# Altium footprint library LEMO THD_OLD.PcbLib: 54 footprints (part 1 of 4)
Each footprint in its own frame and in the unit in brackets; x right, y up, seen from the top. Pads: shape width x height; smd on the part's side, far side on the other; paste and mask are expansions set on the pad; w line width, h text height; cw(c..) or ccw(c..) is an arc to the next point about the centre after c.
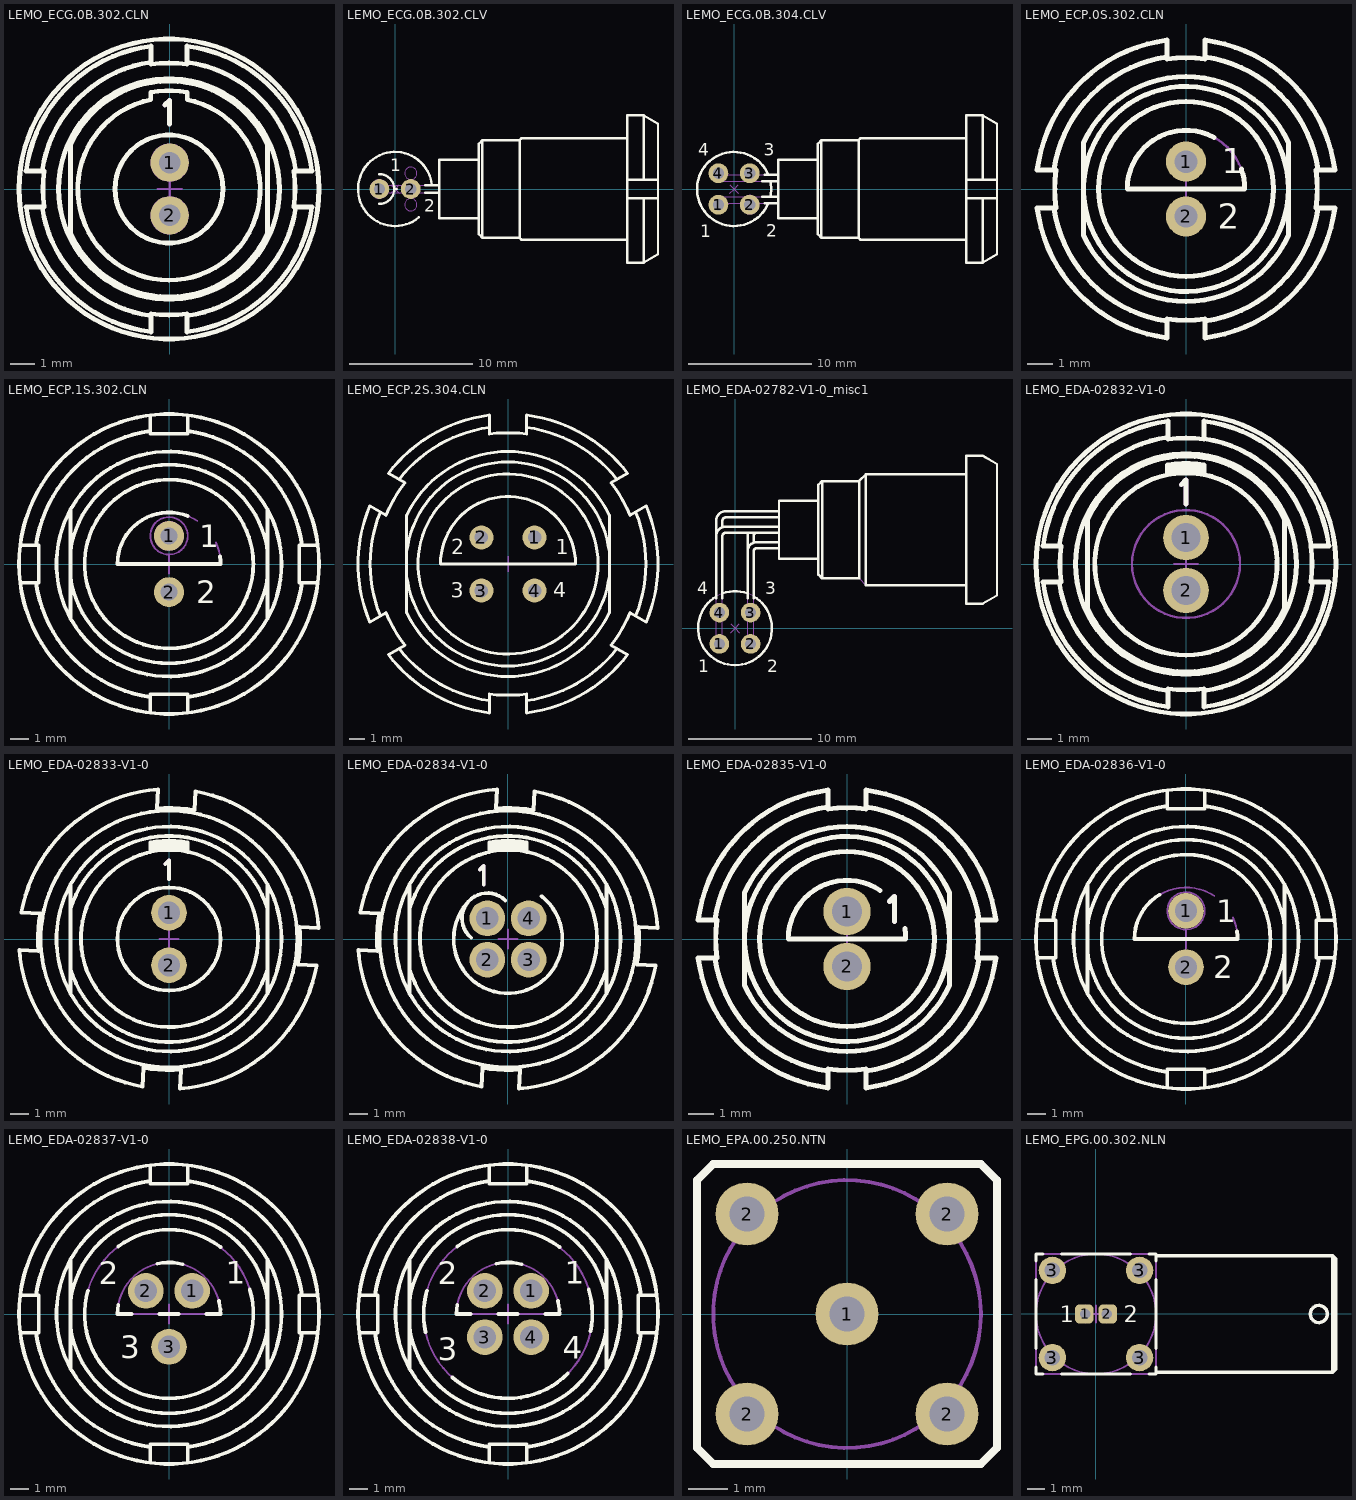
[diagram p0: the footprints below, top view; thin cyan lines are the x and y axes]

## LEMO_ECG.0B.302.CLN [mm] "Size 0B, 2 Female Contacts Straight Receptacle With Two Nut For Panel Mounting"
height 16.4
pads (2):
  round 1.6 hole 0.9: 1(0,1.1) 2(0,-1.1)
Top Overlay:
  circle w0.2: c-0.025,0 r2.25
  circle w0.2: c-0.025,0 r6.25
  circle w0.2: c-0.025,0 r4.6
  lines w0.2: -5.308,-0.75 ccw(c-0.025,0) -0.775,-5.283 ; -5.308,0.75 cw(c-0.025,0) -0.775,5.283 ; -0.2,3.5 0,3.7 0,2.7 ; 0.725,-5.283 ccw(c-0.025,0) 5.258,-0.75 ; 0.725,5.283 cw(c0.031,0.056) 5.258,0.75 ; -4.125,-1.855 ccw(c-0.025,0) 4.075,-1.855 ; -4.125,-1.855 ccw(c-0.025,0) 4.075,-1.855 ; -4.125,-1.855 -4.125,1.855 cw(c-0.025,0) 4.075,1.855 4.075,-1.855 ; -5.978,-0.75 ccw(c-0.025,0) -0.775,-5.953 -0.775,-5.196 ccw(c-0.025,0) 0.725,-5.196 0.725,-5.953 ccw(c-0.025,0) 5.928,-0.75 5.171,-0.75 ccw(c-0.025,0) 5.171,0.75 5.928,0.75 ccw(c-0.025,0) 0.725,5.953 0.725,5.196 ccw(c-0.025,0) -0.775,5.196 -0.775,5.953 ccw(c-0.025,0) -5.978,0.75 -5.221,0.75 ccw(c-0.025,0) -5.221,-0.75 -5.978,-0.75 ; -0.785,3.723 ccw(c-0.025,0) 0.735,3.723 0.735,4.029 ccw(c-0.025,0) -0.785,4.029 -0.785,3.723
Mechanical 8:
  lines w0.1: -0.5,-1.1 0,-1.1 ; -0.5,0 0,0 ; -0.5,1.1 0,1.1 ; 0,-1.6 0,-1.1 ; 0,-0.6 0,-1.1 ; 0,-0.5 0,0 ; 0,0.5 0,0 ; 0,0.6 0,1.1 ; 0,1.6 0,1.1 ; 0.5,-1.1 0,-1.1 ; 0.5,0 0,0 ; 0.5,1.1 0,1.1
Mechanical 14:
  circle w0.1: c0,1.1 r0.75
  circle w0.1: c0,-1.1 r0.75
  circle w0.1: c0,-1.1 r0.55
  circle w0.1: c0,1.1 r0.55
  circle w0.1: c-0.025,0 r2.25
  circle w0.1: c-0.025,0 r4.6
  circle w0.1: c-0.025,0 r6.25
  lines w0.1: -5.308,-0.75 ccw(c-0.025,0) -0.775,-5.283 ; -5.308,0.75 cw(c-0.025,0) -0.775,5.283 ; 0.725,-5.283 ccw(c-0.025,0) 5.258,-0.75 ; 0.725,5.283 cw(c0.031,0.056) 5.258,0.75 ; -4.125,-1.855 ccw(c-0.025,0) 4.075,-1.855 ; -4.125,-1.855 ccw(c-0.025,0) 4.075,-1.855 ; -4.125,-1.855 -4.125,1.855 cw(c-0.025,0) 4.075,1.855 4.075,-1.855 ; -5.978,-0.75 ccw(c-0.025,0) -0.775,-5.953 -0.775,-5.196 ccw(c-0.025,0) 0.725,-5.196 0.725,-5.953 ccw(c-0.025,0) 5.928,-0.75 5.171,-0.75 ccw(c-0.025,0) 5.171,0.75 5.928,0.75 ccw(c-0.025,0) 0.725,5.953 0.725,5.196 ccw(c-0.025,0) -0.775,5.196 -0.775,5.953 ccw(c-0.025,0) -5.978,0.75 -5.221,0.75 ccw(c-0.025,0) -5.221,-0.75 -5.978,-0.75 ; -0.785,3.723 ccw(c-0.025,0) 0.735,3.723 0.735,4.029 ccw(c-0.025,0) -0.785,4.029 -0.785,3.723
  lines w0.2: -0.2,3.5 0,3.7 0,2.7
3D body "LEMO_ECG.0B.302.CLN_Part2.stp": height 16.1, standoff 13.6, extent -5.978,-5.953 5.928,5.953
3D body "LEMO_ECG.0B.302.CLN_Part3.stp": height 11.3, standoff 10.3, extent -6.275,-6.25 6.225,6.25
3D body "LEMO_ECG.0B.302.CLN_Part4.stp": height 10.3, standoff 8.29, extent -5.525,-6.199 5.475,6.199
3D body "LEMO_ECG.0B.302.CLN_Part1.stp": height 16.5, standoff -3, extent -4.125,-4.482 4.075,4.483

## LEMO_ECG.0B.302.CLV [mm] "Size 0B, 2 Female Contacts Elbow Receptacle (90°) With Two Nut For Panel Mounting"
height 15.5
pads (2):
  round 1.6 hole 0.9: 1(-1.27,0) 2(1.27,0)
Top Overlay:
  lines w0.2: -1.27,-1.2 ccw(c-1.27,0) -1.27,1.2 ; 0,0 0.125,0 ; 1.923,-2.303 cw(c0,0) 2.985,0.3 ; 2.432,-0.3 3.57,-0.3 ; 2.432,0.3 3.57,0.3 ; 6.77,-2.36 3.57,-2.36 3.57,2.36 6.77,2.36 ; 18.77,-4.1 10.22,-4.1 10.07,-3.95 ; 18.77,-0.75 21.27,-0.75 ; 18.77,0.75 21.27,0.75 ; 18.77,4.1 10.22,4.1 10.07,3.95 ; 20.12,-0.75 20.12,-5.953 ; 20.12,0.75 20.12,5.953 ; 7.07,-3.95 6.77,-3.65 6.77,3.65 7.07,3.95 ; 7.07,-3.95 10.07,-3.95 ; 7.07,-3.95 7.07,3.95 ; 7.07,3.95 10.07,3.95 ; 10.07,-3.95 10.07,3.95 ; 20.12,-5.953 21.27,-5.283 21.27,5.283 20.12,5.953 ; 20.12,-5.953 18.77,-5.953 18.77,5.953 20.12,5.953
  text "2" at 2.352,-1.842 h1
  text "1" at -0.4,1.425 h1
Mechanical 8:
  lines w0.1: -1.77,0 -1.27,0 ; -1.27,-0.5 -1.27,0 ; -1.27,0.5 -1.27,0 ; -0.77,0 -1.27,0 ; -0.354,-0.354 0,0 ; -0.354,0.354 0,0 ; 0.354,-0.354 0,0 ; 0.354,0.354 0,0 ; 0.77,0 1.27,0 ; 1.27,-0.5 1.27,0 ; 1.27,0.5 1.27,0 ; 1.77,0 1.27,0
Mechanical 14:
  circle w0.1: c1.27,1.27 r0.498
  circle w0.1: c1.27,-1.27 r0.498
  lines w0.1: -1.27,-1.2 ccw(c-1.27,0) -1.27,1.2 ; -0.583,-0.3 cw(c-1.27,0) -0.583,0.3 ; 0,0 0.125,0 ; 0.872,-0.3 ccw(c1.27,0) 1.668,-0.3 ; 0.872,0.3 cw(c1.27,0) 1.668,0.3 ; 1.923,-2.303 cw(c0,0) 2.985,0.3 ; 3.57,-0.3 -1.27,-0.3 cw(c-1.27,0) -1.27,0.3 3.57,0.3 ; 6.77,-2.36 3.57,-2.36 3.57,2.36 6.77,2.36 ; 18.77,-4.1 10.22,-4.1 10.07,-3.95 ; 18.77,-0.75 21.27,-0.75 ; 18.77,0.75 21.27,0.75 ; 18.77,4.1 10.22,4.1 10.07,3.95 ; 20.12,-0.75 20.12,-5.953 ; 20.12,0.75 20.12,5.953 ; 7.07,-3.95 6.77,-3.65 6.77,3.65 7.07,3.95 ; 7.07,-3.95 10.07,-3.95 ; 7.07,-3.95 7.07,3.95 ; 7.07,3.95 10.07,3.95 ; 10.07,-3.95 10.07,3.95 ; 20.12,-5.953 21.27,-5.283 21.27,5.283 20.12,5.953 ; 20.12,-5.953 18.77,-5.953 18.77,5.953 20.12,5.953
  text "2" at 2.352,-1.842 h1
  text "1" at -0.4,1.425 h1
3D body "LEMO_ECG.0B.302.CLV_Part1.stp": height 10.73, standoff -3.7, extent -1.57,-4.1 21.27,4.1
3D body "LEMO_ECG.0B.302.CLV_Part2.stp": height 12.2, standoff 0.3, extent 18.77,-5.953 21.27,5.953
3D body "LEMO_ECG.0B.302.CLV_Part3.stp": height 12.5, standoff 0, extent 15.27,-6.25 16.27,6.25
3D body "LEMO_ECG.0B.302.CLV_Part4.stp": height 12.45, standoff 0.05, extent 13.265,-5.5 15.265,5.5
3D body "LEMO_ECG.0B.302.CLV_Part5.stp": height 2.3, standoff 0, extent -3,-3 3,3
3D body "LEMO_ECG.0B.302.CLV_Part6.stp": height -3.7, standoff -8.7, extent -1.57,-0.3 1.57,0.3
3D body "LEMO_ECG.0B.302.CLV_Part7.stp": height -8.7, standoff -13.7, extent -1.57,-0.3 1.57,0.3
3D body "LEMO_ECG.0B.302.CLV_Part8.stp": height -8.7, standoff -13.7, extent -1.57,-0.3 1.57,0.3
3D body "LEMO_ECG.0B.302.CLV_Part9.stp": height -13.7, standoff -18.7, extent -1.57,-0.3 1.57,0.3
3D body "LEMO_ECG.0B.302.CLV_Part10.stp": height -18.7, standoff -23.7, extent -1.57,-0.3 1.57,0.3
3D body "LEMO_ECG.0B.302.CLV_Part11.stp": height -23.7, standoff -28.7, extent -1.57,-0.3 1.57,0.3
3D body "LEMO_ECG.0B.302.CLV_Part12.stp": height -28.7, standoff -33.7, extent -1.57,-0.3 1.57,0.3
3D body "LEMO_ECG.0B.302.CLV_Part13.stp": height -33.7, standoff -38.7, extent -1.57,-0.3 1.57,0.3

## LEMO_ECG.0B.304.CLV [mm] "Size 0B, 4 Female Contacts Elbow Receptacle (90°) With Two Nut For Panel Mounting"
height 15.5
pads (4):
  round 1.6 hole 0.9: 1(-1.27,-1.27) 2(1.27,-1.27) 3(1.27,1.27) 4(-1.27,1.27)
Top Overlay:
  lines w0.2: 2.288,-0.634 3.57,-0.634 ; 2.288,0.634 3.57,0.634 ; 2.462,-1.134 3.57,-1.134 ; 2.462,1.134 3.57,1.134 ; 2.777,-1.134 cw(c0,0) 2.777,1.134 ; 2.932,-0.634 ccw(c0,0) 2.932,0.634 ; 6.77,-2.36 3.57,-2.36 3.57,2.36 6.77,2.36 ; 18.77,-4.1 10.22,-4.1 10.07,-3.95 ; 18.77,-0.75 21.27,-0.75 ; 18.77,0.75 21.27,0.75 ; 18.77,4.1 10.22,4.1 10.07,3.95 ; 20.12,-0.75 20.12,-5.953 ; 20.12,0.75 20.12,5.953 ; 21.27,-4.1 21.27,4.1 ; 7.07,-3.95 7.07,3.95 ; 7.07,-3.95 10.07,-3.95 ; 7.07,-3.95 6.77,-3.65 6.77,3.65 7.07,3.95 ; 7.07,3.95 10.07,3.95 ; 10.07,-3.95 10.07,3.95 ; 20.12,-5.953 18.77,-5.953 18.77,5.953 20.12,5.953 ; 20.12,-5.953 21.27,-5.283 21.27,5.283 20.12,5.953
  text "2" at 2.602,-3.868 h1
  text "1" at -2.75,-3.9 h1
  text "3" at 2.402,2.708 h1
  text "4" at -2.898,2.708 h1
Mechanical 8:
  lines w0.1: -1.77,-1.27 -1.27,-1.27 ; -1.77,1.27 -1.27,1.27 ; -1.27,-1.77 -1.27,-1.27 ; -1.27,-0.77 -1.27,-1.27 ; -1.27,0.77 -1.27,1.27 ; -1.27,1.77 -1.27,1.27 ; -0.77,-1.27 -1.27,-1.27 ; -0.77,1.27 -1.27,1.27 ; -0.354,-0.354 0,0 ; -0.354,0.354 0,0 ; 0.354,-0.354 0,0 ; 0.354,0.354 0,0 ; 0.77,-1.27 1.27,-1.27 ; 0.77,1.27 1.27,1.27 ; 1.27,-1.77 1.27,-1.27 ; 1.27,-0.77 1.27,-1.27 ; 1.27,0.77 1.27,1.27 ; 1.27,1.77 1.27,1.27 ; 1.77,-1.27 1.27,-1.27 ; 1.77,1.27 1.27,1.27
Mechanical 14:
  lines w0.1: -1.514,-1.055 ccw(c-1.27,-1.27) -0.969,-1.147 ; -1.514,1.055 cw(c-1.27,1.27) -0.969,1.147 ; 0.532,-1.134 ccw(c1.27,-1.27) 2.008,-1.134 ; 0.873,-0.634 cw(c1.27,-1.27) 1.667,-0.634 ; 0.975,1.134 cw(c1.27,1.27) 1.565,1.134 ; 1.02,-1.134 1.02,-1.27 ccw(c1.27,-1.27) 1.52,-1.27 1.52,-1.134 ; 1.02,1.134 1.02,1.27 cw(c1.27,1.27) 1.52,1.27 1.52,1.134 ; 2.777,-1.134 cw(c0,0) 2.777,1.134 ; 2.932,-0.634 ccw(c0,0) 2.932,0.634 ; 3.57,-1.134 -0.92,-1.134 ccw(c-0.92,-1.234) -1.02,-1.234 -1.02,-1.27 cw(c-1.27,-1.27) -1.52,-1.27 -1.52,-1.134 cw(c-1.02,-1.134) -1.02,-0.634 3.57,-0.634 ; 3.57,0.634 -1.02,0.634 cw(c-1.02,1.134) -1.52,1.134 -1.52,1.27 cw(c-1.27,1.27) -1.02,1.27 -1.02,1.234 ccw(c-0.92,1.234) -0.92,1.134 3.57,1.134 ; 6.77,-2.36 3.57,-2.36 3.57,2.36 6.77,2.36 ; 18.77,-4.1 10.22,-4.1 10.07,-3.95 ; 18.77,-0.75 21.27,-0.75 ; 18.77,0.75 21.27,0.75 ; 18.77,4.1 10.22,4.1 10.07,3.95 ; 20.12,-0.75 20.12,-5.953 ; 20.12,0.75 20.12,5.953 ; 21.27,-4.1 21.27,4.1 ; 7.07,-3.95 7.07,3.95 ; 7.07,-3.95 10.07,-3.95 ; 7.07,-3.95 6.77,-3.65 6.77,3.65 7.07,3.95 ; 7.07,3.95 10.07,3.95 ; 10.07,-3.95 10.07,3.95 ; 20.12,-5.953 18.77,-5.953 18.77,5.953 20.12,5.953 ; 20.12,-5.953 21.27,-5.283 21.27,5.283 20.12,5.953
  text "2" at 2.602,-3.868 h1
  text "1" at -2.75,-3.9 h1
  text "3" at 2.402,2.708 h1
  text "4" at -2.898,2.708 h1
3D body "LEMO_ECG.0B.304.CLV_Part12.stp": height -33.7, standoff -38.7, extent -1.52,-1.52 1.52,1.52
3D body "LEMO_ECG.0B.304.CLV_Part11.stp": height -28.7, standoff -33.7, extent -1.52,-1.52 1.52,1.52
3D body "LEMO_ECG.0B.304.CLV_Part10.stp": height -23.7, standoff -28.7, extent -1.52,-1.52 1.52,1.52
3D body "LEMO_ECG.0B.304.CLV_Part7.stp": height -8.7, standoff -13.7, extent -1.52,-1.52 1.52,1.52
3D body "LEMO_ECG.0B.304.CLV_Part6.stp": height -3.7, standoff -8.7, extent -1.52,-1.52 1.52,1.52
3D body "LEMO_ECG.0B.304.CLV_Part2.stp": height 12.2, standoff 0.3, extent 18.77,-5.953 21.27,5.953
3D body "LEMO_ECG.0B.304.CLV_Part1.stp": height 10.75, standoff -3.7, extent -1.52,-4.1 21.27,4.1
3D body "LEMO_ECG.0B.304.CLV_Part3.stp": height 12.5, standoff 0, extent 15.27,-6.25 16.27,6.25
3D body "LEMO_ECG.0B.304.CLV_Part4.stp": height 12.45, standoff 0.05, extent 13.265,-5.5 15.265,5.5
3D body "LEMO_ECG.0B.304.CLV_Part5.stp": height 2.3, standoff 0, extent -3,-3 3,3
3D body "LEMO_ECG.0B.304.CLV_Part8.stp": height -13.7, standoff -18.7, extent -1.52,-1.52 1.52,1.52
3D body "LEMO_ECG.0B.304.CLV_Part9.stp": height -18.7, standoff -23.7, extent -1.52,-1.52 1.52,1.52

## LEMO_ECP.0S.302.CLN [mm] "Size 0S, Fixed Receptacle with 2 Nuts, Straight Contacts 1 Female + 1 Male  (Hermaphroditic Keying)"
height 15
pads (2):
  round 1.6 hole 0.9: 1(0,1.1) 2(0,-1.1)
Top Overlay:
  circle w0.2: c0,0 r3.5
  circle w0.2: c0,0 r4.1
  lines w0.2: -5.283,-0.75 ccw(c0,0) -0.75,-5.283 ; -5.283,0.75 cw(c0,0) -0.75,5.283 ; 0.75,-5.283 ccw(c0,0) 5.283,-0.75 ; 0.75,5.283 cw(c0,0) 5.283,0.75 ; 1.114,2.069 ccw(c0,0) -2.35,0 2.35,0 ccw(c0,0) 2.213,0.79 ; -5.953,-0.75 ccw(c0,0) -0.75,-5.953 -0.75,-5.196 ccw(c0,0) 0.75,-5.196 0.75,-5.953 ccw(c0,0) 5.953,-0.75 5.196,-0.75 ccw(c0,0) 5.196,0.75 5.953,0.75 ccw(c0,0) 0.75,5.953 0.75,5.196 ccw(c0,0) -0.75,5.196 -0.75,5.953 ccw(c0,0) -5.953,0.75 -5.196,0.75 ccw(c0,0) -5.196,-0.75 -5.953,-0.75 ; -4.1,-1.855 ccw(c0,0) 4.1,-1.855 4.1,1.855 ccw(c0,0) -4.1,1.855 -4.1,-1.855
  text "2" at 1.27,-1.587 h1
  text "1" at 1.429,0.635 h1
Mechanical 8:
  lines w0.1: -0.5,-1.1 0,-1.1 ; -0.5,0 0,0 ; -0.5,1.1 0,1.1 ; 0,-1.6 0,-1.1 ; 0,-0.6 0,-1.1 ; 0,-0.5 0,0 ; 0,0.5 0,0 ; 0,0.6 0,1.1 ; 0,1.6 0,1.1 ; 0.5,-1.1 0,-1.1 ; 0.5,0 0,0 ; 0.5,1.1 0,1.1
Mechanical 14:
  circle w0.1: c0,-1.1 r0.35
  circle w0.4: c0,-1.1 r0.2
  circle w0.1: c0,1.1 r0.35
  circle w0.1: c0,0 r3.5
  circle w0.1: c0,0 r4.1
  lines w0.1: -5.283,-0.75 ccw(c0,0) -0.75,-5.283 ; -5.283,0.75 cw(c0,0) -0.75,5.283 ; 0.75,-5.283 ccw(c0,0) 5.283,-0.75 ; 0.75,5.283 cw(c0,0) 5.283,0.75 ; -5.953,-0.75 ccw(c0,0) -0.75,-5.953 -0.75,-5.196 ccw(c0,0) 0.75,-5.196 0.75,-5.953 ccw(c0,0) 5.953,-0.75 5.196,-0.75 ccw(c0,0) 5.196,0.75 5.953,0.75 ccw(c0,0) 0.75,5.953 0.75,5.196 ccw(c0,0) -0.75,5.196 -0.75,5.953 ccw(c0,0) -5.953,0.75 -5.196,0.75 ccw(c0,0) -5.196,-0.75 -5.953,-0.75 ; -4.1,-1.855 ccw(c0,0) 4.1,-1.855 4.1,1.855 ccw(c0,0) -4.1,1.855 -4.1,-1.855 ; -2.35,0 cw(c0,0) 2.35,0 -2.35,0
  text "2" at 1.27,-1.587 h1
  text "1" at 1.429,0.635 h1
3D body "LEMO_ECP.0S.302.CLN_Part1.stp": height 15, standoff -3.2, extent -4.1,-4.463 4.1,4.464
3D body "LEMO_ECP.0S.302.CLN_Part2.stp": height 14.6, standoff 12.1, extent -5.953,-5.953 5.953,5.953
3D body "LEMO_ECP.0S.302.CLN_Part4.stp": height 9.6, standoff 8.6, extent -6.25,-6.25 6.25,6.25
3D body "LEMO_ECP.0S.302.CLN_Part3.stp": height 8.58, standoff 6.58, extent -5.5,-6.199 5.5,6.199

## LEMO_ECP.1S.302.CLN [mm] "Size 1S, Fixed Receptacle with 2 Nuts, Straight Contacts 1 Female + 1 Male  (Hermaphroditic Keying)"
height 19.5
pads (2):
  round 1.6 hole 0.9: 1(0,1.5) 2(0,-1.5)
Top Overlay:
  circle w0.2: c0,0 r8
  circle w0.2: c0,0 r6
  circle w0.2: c0,0 r4.5
  lines w0.2: -7.937,-1 -6.95,-1 -6.95,1 -7.937,1 ; -7.093,-1 ccw(c0,0) -1,-7.093 ; -7.093,1 cw(c0,0) -1,7.093 ; -5.25,-2.905 -5.25,2.905 ; -5.25,-0.726 ccw(c0,0) 5.25,-0.726 ; -5.25,0.726 cw(c0,0) 5.25,0.726 ; -1,-7.937 -1,-6.95 1,-6.95 1,-7.937 ; -1,7.937 -1,6.95 1,6.95 1,7.937 ; 1,-7.093 ccw(c0,0) 7.093,-1 ; 1,2.562 ccw(c0,0) -2.75,0 2.75,0 ccw(c0,0) 2.721,0.4 ; 1,7.093 cw(c0,0) 7.093,1 ; 5.25,-2.905 5.25,2.905 ; 7.937,-1 6.95,-1 6.95,1 7.937,1
  text "1" at 1.6,0.9 h1.2
  text "2" at 1.459,-2.1 h1.2
Mechanical 8:
  lines w0.1: -0.5,-1.5 0,-1.5 ; -0.5,0 0,0 ; -0.5,1.5 0,1.5 ; 0,-2 0,-1.5 ; 0,-1 0,-1.5 ; 0,-0.5 0,0 ; 0,0.5 0,0 ; 0,1 0,1.5 ; 0,2 0,1.5 ; 0.5,-1.5 0,-1.5 ; 0.5,0 0,0 ; 0.5,1.5 0,1.5
Mechanical 14:
  circle w0.1: c0,0 r8
  circle w0.1: c0,0 r6
  circle w0.1: c0,1.5 r0.75
  circle w0.1: c0,1.5 r1
  circle w0.1: c0,-1.5 r0.5
  circle w0.1: c0,0 r4.5
  lines w0.1: -7.937,-1 -6.95,-1 -6.95,1 -7.937,1 ; -7.093,-1 ccw(c0,0) -1,-7.093 ; -7.093,1 cw(c0,0) -1,7.093 ; -5.25,-2.905 -5.25,2.905 ; -5.25,-0.726 ccw(c0,0) 5.25,-0.726 ; -5.25,0.726 cw(c0,0) 5.25,0.726 ; -1,-7.937 -1,-6.95 1,-6.95 1,-7.937 ; -1,7.937 -1,6.95 1,6.95 1,7.937 ; 1,-7.093 ccw(c0,0) 7.093,-1 ; 1,7.093 cw(c0,0) 7.093,1 ; 1.507,2.3 ccw(c0,0) -2.75,0 2.75,0 ccw(c0,0) 2.5,1.146 ; 5.25,-2.905 5.25,2.905 ; 7.937,-1 6.95,-1 6.95,1 7.937,1
  text "1" at 1.6,0.9 h1.2
  text "2" at 1.459,-2.1 h1.2
3D body "LEMO_ECP.1S.302.CLN_Part4.stp": height 12.8, standoff 11.8, extent -8,-8 8,8
3D body "LEMO_ECP.1S.302.CLN_Part3.stp": height 11.8, standoff 9.3, extent -7,-7.899 7,7.899
3D body "LEMO_ECP.1S.302.CLN_Part2.stp": height 18.8, standoff 15.3, extent -7.937,-7.937 7.937,7.937
3D body "LEMO_ECP.1S.302.CLN_Part1.stp": height 19.5, standoff -3, extent -5.25,-6 5.25,6

## LEMO_ECP.2S.304.CLN [mm] "Size 2S, Fixed Receptacle with 2 Nuts, Straight Contacts 2 Females + 2 Males  (Hermaphroditic Keying)"
height 20
pads (4):
  round 1.6 hole 0.9: 1(1.768,1.768) 2(-1.768,1.768) 3(-1.768,-1.768) 4(1.768,-1.768)
Top Overlay:
  circle w0.2: c0,0 r6
  lines w0.2: -8.511,-3.471 cw(c0,0) -8.511,3.471 ; -7.261,-5.636 ccw(c0,0) -1.25,-9.106 ; -7.261,5.636 cw(c0,0) -1.25,9.106 ; -6.75,-0.823 ccw(c0,0) 6.75,-0.823 ; -6.75,0.823 cw(c0,0) 6.75,0.823 ; 1.25,-9.106 ccw(c0,0) 7.261,-5.636 ; 1.25,9.106 cw(c0,0) 7.261,5.636 ; 8.511,-3.471 ccw(c0,0) 8.511,3.471 ; -9.217,-3.878 cw(c0,0) -9.217,3.878 -8.125,3.248 cw(c0,0) -6.875,5.413 -7.967,6.043 cw(c0,0) -1.25,9.922 -1.25,8.66 cw(c0,0) 1.25,8.66 1.25,9.922 cw(c0,0) 7.967,6.043 6.875,5.413 cw(c0,0) 8.125,3.248 9.217,3.878 cw(c0,0) 9.217,-3.878 8.125,-3.248 cw(c0,0) 6.875,-5.413 7.967,-6.043 cw(c0,0) 1.25,-9.922 1.25,-8.66 cw(c0,0) -1.25,-8.66 -1.25,-9.922 cw(c0,0) -7.967,-6.043 -6.875,-5.413 cw(c0,0) -8.125,-3.248 -9.217,-3.878 ; -6.75,-3.269 ccw(c0,0) 6.75,-3.269 6.75,3.269 ccw(c0,0) -6.75,3.269 -6.75,-3.269 ; -4.5,0 cw(c0,0) 4.5,0 -4.5,0
  text "1" at 3.197,0.635 h1
  text "4" at 3.016,-2.222 h1
  text "3" at -3.81,-2.244 h1
  text "2" at -3.788,0.635 h1
Mechanical 8:
  lines w0.1: -2.268,-1.768 -1.768,-1.768 ; -2.268,1.768 -1.768,1.768 ; -1.768,-2.268 -1.768,-1.768 ; -1.768,-1.268 -1.768,-1.768 ; -1.768,1.268 -1.768,1.768 ; -1.768,2.268 -1.768,1.768 ; -1.268,-1.768 -1.768,-1.768 ; -1.268,1.768 -1.768,1.768 ; -0.5,0 0,0 ; 0,-0.5 0,0 ; 0,0.5 0,0 ; 0.5,0 0,0 ; 1.268,-1.768 1.768,-1.768 ; 1.268,1.768 1.768,1.768 ; 1.768,-2.268 1.768,-1.768 ; 1.768,-1.268 1.768,-1.768 ; 1.768,1.268 1.768,1.768 ; 1.768,2.268 1.768,1.768 ; 2.268,-1.768 1.768,-1.768 ; 2.268,1.768 1.768,1.768
Mechanical 14:
  circle w0.7: c1.768,-1.768 r0.35
  circle w0.7: c-1.768,-1.768 r0.35
  circle w0.1: c-1.768,-1.768 r0.7
  circle w0.1: c1.768,-1.768 r0.7
  circle w0.1: c-1.768,1.768 r0.7
  circle w0.1: c1.768,1.768 r0.7
  circle w0.1: c0,0 r6
  lines w0.1: -8.511,-3.471 cw(c0,0) -8.511,3.471 ; -7.261,-5.636 ccw(c0,0) -1.25,-9.106 ; -7.261,5.636 cw(c0,0) -1.25,9.106 ; -6.75,-0.823 ccw(c0,0) 6.75,-0.823 ; -6.75,0.823 cw(c0,0) 6.75,0.823 ; 1.25,-9.106 ccw(c0,0) 7.261,-5.636 ; 1.25,9.106 cw(c0,0) 7.261,5.636 ; 8.511,-3.471 ccw(c0,0) 8.511,3.471 ; -9.217,-3.878 cw(c0,0) -9.217,3.878 -8.125,3.248 cw(c0,0) -6.875,5.413 -7.967,6.043 cw(c0,0) -1.25,9.922 -1.25,8.66 cw(c0,0) 1.25,8.66 1.25,9.922 cw(c0,0) 7.967,6.043 6.875,5.413 cw(c0,0) 8.125,3.248 9.217,3.878 cw(c0,0) 9.217,-3.878 8.125,-3.248 cw(c0,0) 6.875,-5.413 7.967,-6.043 cw(c0,0) 1.25,-9.922 1.25,-8.66 cw(c0,0) -1.25,-8.66 -1.25,-9.922 cw(c0,0) -7.967,-6.043 -6.875,-5.413 cw(c0,0) -8.125,-3.248 -9.217,-3.878 ; -6.75,-3.269 ccw(c0,0) 6.75,-3.269 6.75,3.269 ccw(c0,0) -6.75,3.269 -6.75,-3.269 ; -4.5,0 cw(c0,0) 4.5,0 -4.5,0
  text "1" at 3.197,0.635 h1
  text "4" at 3.016,-2.222 h1
  text "3" at -3.81,-2.244 h1
  text "2" at -3.788,0.635 h1
3D body "LEMO_ECP.2S.304.CLN_Part1.stp": height 20, standoff -3, extent -6.75,-7.5 6.75,7.5
3D body "LEMO_ECP.2S.304.CLN_Part2.stp": height 19.3, standoff 15.8, extent -9.912,-9.922 9.912,9.922
3D body "LEMO_ECP.2S.304.CLN_Part3.stp": height 12.05, standoff 9.35, extent -8.5,-9.599 8.5,9.599
3D body "LEMO_ECP.2S.304.CLN_Part4.stp": height 13.3, standoff 12.1, extent -9.75,-9.75 9.75,9.75
